# Altium footprint library Connectors.PcbLib: 25 footprints (part 1 of 2)
Each footprint in its own frame and in the unit in brackets; x right, y up, seen from the top. Pads: shape width x height; smd on the part's side, far side on the other; paste and mask are expansions set on the pad; w line width, h text height; cw(c..) or ccw(c..) is an arc to the next point about the centre after c.
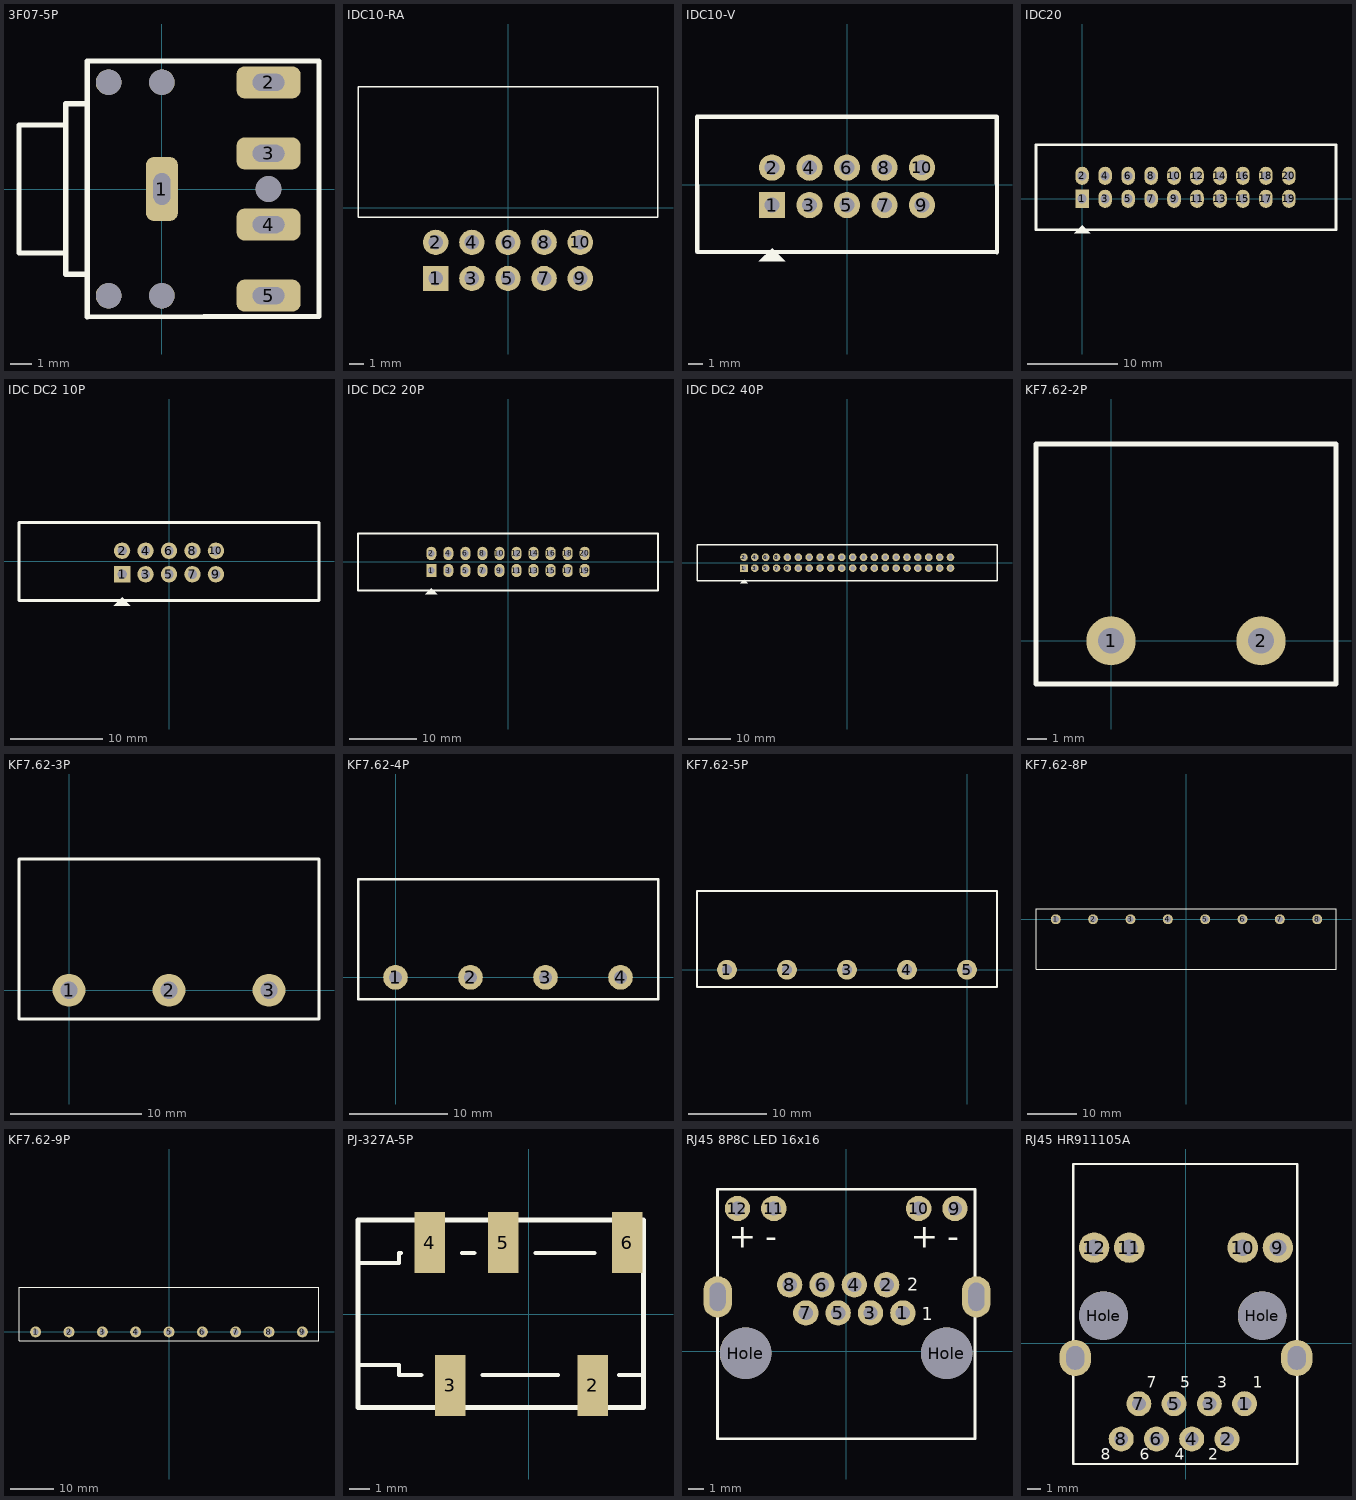
[diagram p0: the footprints below, top view; thin cyan lines are the x and y axes]

## 3F07-5P [mm]
pads (10):
  rrect50% 1.5x3 hole 0.8 slot 1.5 at 90 deg: 1(0,0)
  rrect50% 3x1.5 hole 0.8 slot 1.5 at 0 deg: 2(5,5) 3(5,1.667) 4(5,-1.667) 5(5,-5)
  round 1.2 hole 1.2: ""(-2.5,-5) ""(-2.5,5) ""(0,-5) ""(0,5) ""(5,0)
Top Overlay:
  lines w0.254: -4.501,-4.003 -3.501,-4.003 ; -4.5,-4.002 -4.5,4 -3.6,4 ; -4.5,-3.001 -6.7,-3.001 -6.7,2.999 -4.5,2.999 ; -3.501,-6.003 7.366,-5.969 7.366,6 -3.5,6 -3.5,-6.003
3D body "pj-307n5.stp": height 5.5, standoff -3.5, extent -6.634,-6 7.366,6

## IDC10-RA [mil]
pads (10):
  rect 70x70 hole 40: 1(-200,-195)
  round 70 hole 40: 2(-200,-95) 3(-100,-195) 4(-100,-95) 5(0,-195) 6(0,-95) 7(100,-195) 8(100,-95) 9(200,-195) 10(200,-95)
Top Overlay:
  lines w4: -415,-25 415,-25 415,335 -415,335 -415,-25
3D body "User Library-IDC Socket Male 10pin Angled THT Goldplated 2_54mm.step": height 353.54, standoff -93.31, extent -412.2,-203.86 412.2,330

## IDC10-V [mil]
pads (10):
  rect 70x70 hole 40: 1(-200,-55)
  round 70 hole 40: 2(-200,45) 3(-100,-55) 4(-100,45) 5(0,-55) 6(0,45) 7(100,-55) 8(100,45) 9(200,-55) 10(200,45)
Top Overlay:
  region: -200,-170 -235,-205 -165,-205
  lines w12: -400,-180 -400,181 400,181 400,-180 -400,-180
3D body "User Library-IDC-10M.STEP": height 366.14, standoff -122.05, extent -399.6,-178.23 399.61,180.04

## IDC20 [mm] "Header 10x2,20 pin, connecter"
height 7.62
pads (20):
  rect 1.5x2 hole 1: 1(0,0)
  oval 1.5x2 hole 1: 2(0,2.54) 3(2.54,0) 4(2.54,2.54) 5(5.08,0) 6(5.08,2.54) 7(7.62,0) 8(7.62,2.54) 9(10.16,0) 10(10.16,2.54) 11(12.7,0) 12(12.7,2.54) 13(15.24,0) 14(15.24,2.54) 15(17.78,0) 16(17.78,2.54) 17(20.32,0) 18(20.32,2.54) 19(22.86,0) 20(22.86,2.54)
Top Overlay:
  region: 0,-2.921 -0.889,-3.81 0.889,-3.81
  lines w0.305: -5.1,-3.429 -5.1,5.969 28.067,5.969 28.067,-3.429 -5.1,-3.429
3D body "20 vuong.step": height 9.1, standoff -3, extent -5.094,-3.407 28.106,5.893

## IDC DC2 10P [mil]
pads (10):
  rect 70x70 hole 40: 1(-200,-55)
  round 70 hole 40: 2(-200,45) 3(-100,-55) 4(-100,45) 5(0,-55) 6(0,45) 7(100,-55) 8(100,45) 9(200,-55) 10(200,45)
Top Overlay:
  region: -200,-154 -235,-189 -165,-189
  lines w12: -639.76,-166.34 639.76,-166.34 639.76,166.34 -639.76,166.34 -639.76,-166.34
3D body "User Library-IDC connector 10-pin straight M.STEP": height 1015.76, standoff -124.01, extent -636.83,-165 634.83,169.65

## IDC DC2 20P [mm] "Header 10x2,20 pin, connecter"
height 300
pads (20):
  rect 1.5x2 hole 1: 1(-11.43,-1.27)
  oval 1.5x2 hole 1: 2(-11.43,1.27) 3(-8.89,-1.27) 4(-8.89,1.27) 5(-6.35,-1.27) 6(-6.35,1.27) 7(-3.81,-1.27) 8(-3.81,1.27) 9(-1.27,-1.27) 10(-1.27,1.27) 11(1.27,-1.27) 12(1.27,1.27) 13(3.81,-1.27) 14(3.81,1.27) 15(6.35,-1.27) 16(6.35,1.27) 17(8.89,-1.27) 18(8.89,1.27) 19(11.43,-1.27) 20(11.43,1.27)
Top Overlay:
  region: -11.43,-3.937 -12.319,-4.826 -10.541,-4.826
  lines w0.305: -22.35,-4.225 22.35,-4.225 22.35,4.225 -22.35,4.225 -22.35,-4.225
3D body "User Library-Header-IDC10x2-LongLevers.step": height 25.84, standoff -3.2, extent -22.521,-4.225 22.479,4.275

## IDC DC2 40P [mil] "80 pins, dual row"
height 1102.36
pads (40):
  rect 70x70 hole 40: 1(-950,-50)
  round 70 hole 40: 2(-950,50) 4(-850,50) 5(-750,-50) 6(-750,50) 7(-650,-50) 8(-650,50) 9(-550,-50) 10(-550,50) 11(-450,-50) 12(-450,50) 13(-350,-50) 14(-350,50) 15(-250,-50) 16(-250,50) 17(-150,-50) 18(-150,50) 19(-50,-50) 20(-50,50) 21(50,-50) 22(50,50) 23(150,-50) 24(150,50) 25(250,-50) 26(250,50) 27(350,-50) 28(350,50) 29(450,-50) 30(450,50) 31(550,-50) 32(550,50) 33(650,-50) 34(650,50) 35(750,-50) 36(750,50) 37(850,-50) 38(850,50) 39(950,-50) 40(950,50)
  round 70 hole 43.31: 3(-850,-50)
Top Overlay:
  region: -949,-155 -984,-190 -914,-190
  lines w12: -1381.89,-166.34 1377.95,-166.34 1377.95,166.34 -1381.89,166.34 -1381.89,-166.34
3D body "Header20x2.STEP": height 92, standoff -925.82, extent -1384,-168.16 1381,162.16

## KF7.62-2P [mm]
height 12.4
pads (2):
  round 2.5 hole 1.3: 1(0,0) 2(7.62,0)
Top Overlay:
  lines w0.254: -3.81,-2.192 -3.81,10 11.43,10 11.43,-2.192 -3.81,-2.192
3D body "User Library-kf7_62-2p.STEP": height 12.4, standoff -6.3, extent -3.734,-2.088 11.506,9.912

## KF7.62-3P [mm]
height 12.4
pads (3):
  round 2.5 hole 1.3: 1(0,0) 2(7.62,0) 3(15.24,0)
Top Overlay:
  lines w0.254: -3.81,-2.192 -3.81,10 19.05,10 19.05,-2.192 -3.81,-2.192
3D body "User Library-kf7_62-2p.STEP": height 12.4, standoff -6.3, extent -3.734,-2.088 11.506,9.912
3D body "User Library-kf7_62-2p.STEP": height 12.4, standoff -6.3, extent 3.886,-2.088 19.126,9.912

## KF7.62-4P [mm]
height 12.4
pads (4):
  round 2.5 hole 1.3: 1(0,0) 2(7.62,0) 3(15.24,0) 4(22.86,0)
Top Overlay:
  lines w0.254: -3.81,-2.192 -3.81,10 26.67,10 26.67,-2.192 -3.81,-2.192
3D body "User Library-KF7_62 - 4P-1.STEP": height 12.76, standoff -5.94, extent -3.708,-2.094 26.772,9.906

## KF7.62-5P [mm]
height 12.4
pads (5):
  round 2.5 hole 1.3: 1(-30.48,0) 2(-22.86,0) 3(-15.24,0) 4(-7.62,0) 5(0,0)
Top Overlay:
  lines w0.254: -34.29,-2.192 3.81,-2.192 3.81,10 -34.29,10 -34.29,-2.192
3D body "KF7.62 - 5P.STEP": height 12.26, standoff -6.44, extent -34.265,-2.043 3.835,9.957

## KF7.62-8P [mil]
pads (8):
  round 80 hole 52: 1(-1050,0) 2(-750,0) 3(-450,0) 4(-150,0) 5(150,0) 6(450,0) 7(750,0) 8(1050,0)
Top Overlay:
  lines w10: -1208.94,-401.06 -1208.94,83.94 1201.06,83.94 1201.06,-401.06 -1208.94,-401.06
3D body "User Library-KF7_62 - 4P-1.STEP": height 502.4, standoff -233.82, extent -1203.87,-397.4 -3.87,75.04
3D body "User Library-KF7_62 - 4P-1.STEP": height 502.4, standoff -233.82, extent -3.87,-397.4 1196.13,75.04

## KF7.62-9P [mm]
height 12.4
pads (9):
  round 2.5 hole 1.3: 1(-30.48,0) 2(-22.86,0) 3(-15.24,0) 4(-7.62,0) 5(0,0) 6(7.62,0) 7(15.24,0) 8(22.86,0) 9(30.48,0)
Top Overlay:
  lines w0.254: -34.29,-2 -34.29,10.192 34.29,10.192 34.29,-2 -34.29,-2
3D body "KF7.62 - 9P.STEP": height 5.44, standoff -13.26, extent -34.341,-1.885 34.239,10.115

## PJ-327A-5P [mm]
pads (5):
  rect 1.5x3 smd: 2(3.15,-3.5) 3(-3.85,-3.5) 4(-4.85,3.5) 5(-1.25,3.5) 6(4.85,3.5)
Top Overlay:
  lines w0.2: -6.262,3 -6.362,3 -6.362,2.5 -8.362,2.5 -8.362,-2.5 -6.362,-2.5 -6.362,-3 -5.262,-3 ; -3.262,3 -2.662,3 ; -2.262,-3 1.438,-3 ; 0.338,3 3.238,3 ; 4.438,-3 5.638,-3 5.638,1.8
  lines w0.254: -8.365,-4.586 5.635,-4.586 5.635,4.614 -8.365,4.614 -8.365,-4.586
Mechanical 13:
  lines w0.1: -6.362,-2.5 -8.362,-2.5 -8.362,2.5 -6.362,2.5
3D body "pj-327a0-smt.stp": height 4.7, standoff -0.55, extent -8.452,-4.644 5.548,4.756

## RJ45 8P8C LED 16x16 [mm] "16.26x15.75mm"
height 13.1
pads (16):
  round 1.6 hole 0.9: 1(3.57,2.41) 2(2.55,4.19) 3(1.53,2.41) 4(0.51,4.19) 5(-0.51,2.41) 6(-1.53,4.19) 7(-2.55,2.41) 8(-3.57,4.19) 9(6.86,9) 10(4.57,9) 11(-4.57,9) 12(-6.86,9)
  round 3.25 hole 3.25: Hole(-6.35,-0.13) Hole(6.335,-0.13)
  oval 1.8x2.6 hole 1.8 slot 1 at 0 deg: ""(-8.115,3.43) ""(8.21,3.43)
Top Overlay:
  lines w0.178: -8.13,-5.53 -8.13,10.22 8.13,10.22 8.13,-5.53 -8.13,-5.53
  text "2" at 3.843,3.796 h0.81
  text "1" at 4.757,1.941 h0.81
  text "-" at 6.375,6.528 h1.52
  text "+" at 4.064,6.528 h1.52
  text "-" at -5.105,6.528 h1.52
  text "+" at -7.417,6.528 h1.52
3D body "RJHSE-5381_COLORED.step": height 3.42, standoff -15.42, extent -8.39,-5.763 8.441,10.44

## RJ45 HR911105A [mm] "16x21mm"
height 13.65
pads (16):
  round 1.8 hole 1: 1(4.223,-4.355) 2(2.953,-6.895) 3(1.683,-4.355) 4(0.413,-6.895) 5(-0.857,-4.355) 6(-2.127,-6.895) 7(-3.397,-4.355) 8(-4.667,-6.895)
  round 2.2 hole 1.2 mask+0: 9(6.625,6.895) 10(4.085,6.895) 11(-4.085,6.895) 12(-6.625,6.895)
  round 3.5 hole 3.5: Hole(-5.942,1.995) Hole(5.488,1.995)
  oval 2.3x2.6 hole 1.7 slot 1.3 at 0 deg: ""(-7.977,-1.055) ""(7.977,-1.055)
Top Overlay:
  lines w0.178: -8.128,-8.698 8.001,-8.698 8.001,-6.717 8.001,12.917 -8.128,12.917 -8.128,-8.698
  text "8" at -6.128,-8.395 h0.81
  text "6" at -3.334,-8.395 h0.81
  text "4" at -0.794,-8.395 h0.81
  text "7" at -2.826,-3.188 h0.81
  text "5" at -0.413,-3.188 h0.81
  text "3" at 2.254,-3.188 h0.81
  text "1" at 4.794,-3.188 h0.81
  text "2" at 1.619,-8.395 h0.81
3D body "User Library-HR911105A.step": height 13.5, standoff -3, extent -8.006,-8.541 7.874,12.859